# Altium footprint library MH_DA_THU_VIEN_16122016.PcbLib: 531 footprints (part 3 of 34)
Each footprint in its own frame and in the unit in brackets; x right, y up, seen from the top. Pads: shape width x height; smd on the part's side, far side on the other; paste and mask are expansions set on the pad; w line width, h text height; cw(c..) or ccw(c..) is an arc to the next point about the centre after c.
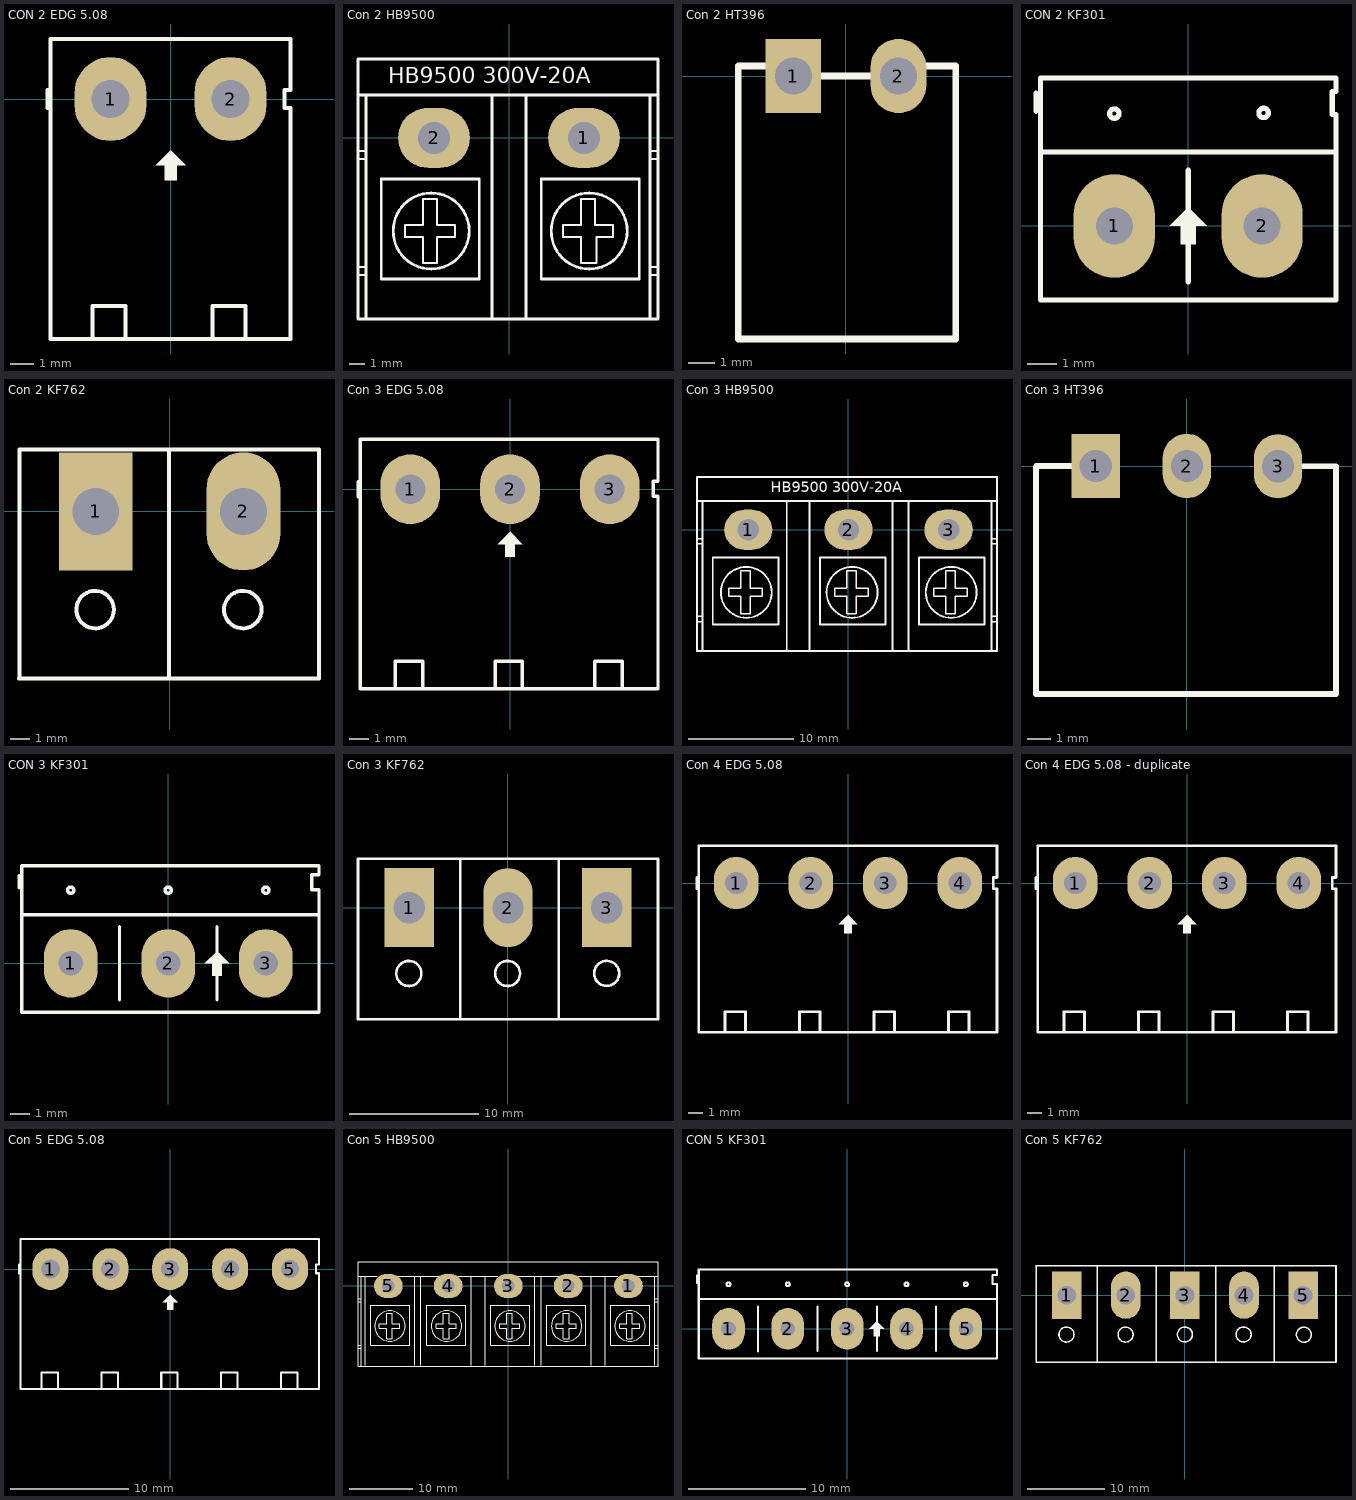
[diagram p2: the footprints below, top view; thin cyan lines are the x and y axes]

## CON 2 EDG 5.08 [mil]
pads (2):
  oval 120x140 hole 62.99: 1(-100,0) 2(100,0)
Top Overlay:
  region: 0,-85 -25,-110 -10,-110 -10,-135 10,-135 10,-110 25,-110
  lines w7: -205,-15 -205,15 ; -200,77 -200,-400 200,-400 200,-15 190,-15 190,15 200,15 200,77 ; -200,100 200,100 ; -130,-400 -130,-345 -75,-345 -75,-400 ; 70,-400 70,-345 125,-345 125,-400
  lines w7.01: -200,77 -200,100 ; 200,76 200,100
3D body: height 333.51, standoff -157.48, extent -196.7,-399.22 197,73.22

## Con 2 HB9500 [mil]
pads (2):
  oval 180x150 hole 80: 1(187.5,0) 2(-187.5,0)
Top Overlay:
  circle w7: c-194.5,-233 r95
  circle w7: c200.5,-233 r95
  lines w5: -375,-343 -360,-343 ; -375,-323 -360,-323 ; -375,-53 -360,-53 ; -375,-33 -360,-33 ; 355,-343 370,-343 ; 355,-323 370,-323 ; 355,-53 370,-53 ; 355,-33 370,-33 ; -259.5,-248 -259.5,-218 -214.5,-218 -214.5,-153 -179.5,-153 -179.5,-218 -134.5,-218 -134.5,-248 -179.5,-248 -179.5,-313 -214.5,-313 -214.5,-248 -259.5,-248 ; 135.5,-248 180.5,-248 180.5,-313 218.5,-313 218.5,-248 260.5,-248 260.5,-218 215.5,-218 215.5,-153 180.5,-153 180.5,-218 135.5,-218 135.5,-248
  lines w7: -377.5,107 -247.5,107 ; -377.5,196.85 372.5,196.85 ; -377.5,197 -377.5,-453 372.5,-453 372.5,197 ; -357.5,-448 -357.5,107 ; -253.5,107 242.5,107 372.5,107 ; -42.5,-448 -42.5,107 ; 42.5,-448 42.5,107 ; 352.5,-448 352.5,107 ; -319.5,-353 -74.5,-353 -74.5,-103 -319.5,-103 -319.5,-353 ; 80.5,-353 80.5,-103 325.5,-103 325.5,-353 80.5,-353
  text "HB9500 300V-20A" at -302.5,137 h40
3D body: height 500.6, standoff -199.4, extent -354,-424 357,176

## Con 2 HT396 [mm]
pads (2):
  rect 2.1x2.794 hole 1.4: 1(-1.98,0)
  oval 2.1x2.794 hole 1.4: 2(1.98,0)
Top Overlay:
  lines w0.254: -3.065,0.381 -4.056,0.381 -4.056,-9.906 4.14,-9.906 4.14,0.381 2.33,0.381 ccw(c2.33,0.07) 2.11,0.29 ; -1.98,0 1.98,0
3D body: height 7.02, standoff 0.02, extent -4.06,-9.99 3.94,0.01

## CON 2 KF301 [mil]
pads (2):
  oval 110x140 hole 50: 1(-100,0) 2(100,0)
Top Overlay:
  circle w7: c102,153 r6.4
  circle w7: c-100,152 r6.4
  region: 0,25 -25,0 -10,0 -10,-25 10,-25 10,0 25,0
  lines w7: -206,155 -206,180 ; -198,100 199,100 ; -200,-100 -200,50 -200,200 200,200 200,182 195,182 195,151 200,151 200,-100 -200,-100
  lines w7.87: 0,-75 0,75
3D body: height 393.7, standoff -157.48, extent -196.85,-97.64 196.85,197.64

## Con 2 KF762 [mil]
pads (2):
  rect 150x240 hole 95: 1(-150,0)
  oval 150x240 hole 95: 2(150,0)
Top Overlay:
  circle w8: c-151.2,-199.3 r38.08
  circle w8: c148.8,-199.3 r38.08
  lines w7.87: -305.74,-338.57 -305.74,-338.97 303.5,-338.97 ; -305,-339 -305,126 303.26,126 303.26,-338.57 303.26,-338.97 ; -1.2,-339.36 -1.2,125.7

## Con 3 EDG 5.08 [mil]
pads (3):
  oval 120x140 hole 60: 1(-200,0) 2(0,0) 3(200,0)
Top Overlay:
  region: 0,-85 -25,-110 -10,-110 -10,-135 10,-135 10,-110 25,-110
  lines w7: -305.03,-15.03 -305.03,14.97 ; -230.03,-400.03 -230.03,-345.03 -175.03,-345.03 -175.03,-400.03 ; -30.03,-400.03 -30.03,-345.03 24.97,-345.03 24.97,-400.03 ; 169.97,-400.03 169.97,-345.03 224.97,-345.03 224.97,-400.03 ; 296.97,-400.03 -300.03,-400.03 -300.03,99.97 296.97,99.97 296.97,15.97 286.97,15.97 286.97,-14.03 296.97,-14.03 296.97,-399.03
3D body: height 334.11, standoff -156.88, extent -97.96,-404.25 98.9,68.19
3D body: height 334.11, standoff -156.88, extent -296.03,-404.25 -99.18,68.19
3D body: height 334.11, standoff -156.88, extent 100.12,-404.25 296.97,68.19

## Con 3 HB9500 [mil]
pads (3):
  oval 180x150 hole 80: 1(-374.02,0) 2(0,0) 3(374.02,0)
Top Overlay:
  circle w7: c13.5,-234 r95
  circle w7: c-381.5,-234 r95
  circle w7: c383.5,-234 r95
  lines w5: -563,-343 -548,-343 ; -563,-323 -548,-323 ; -563,-53 -548,-53 ; -563,-33 -548,-33 ; 537,-343 552,-343 ; 537,-323 552,-323 ; 537,-53 552,-53 ; 537,-33 552,-33 ; -446.5,-249 -401.5,-249 -401.5,-314 -366.5,-314 -366.5,-249 -321.5,-249 -321.5,-219 -366.5,-219 -366.5,-154 -401.5,-154 -401.5,-219 -446.5,-219 -446.5,-249 ; -51.5,-249 -51.5,-219 -6.5,-219 -6.5,-154 28.5,-154 28.5,-219 73.5,-219 73.5,-249 28.5,-249 28.5,-314 -6.5,-314 -6.5,-249 -51.5,-249 ; 318.5,-249 363.5,-249 363.5,-314 398.5,-314 398.5,-249 443.5,-249 443.5,-219 398.5,-219 398.5,-154 363.5,-154 363.5,-219 318.5,-219 318.5,-249
  lines w7: -565.5,107 -435.5,107 ; -565.5,196.85 554,196.85 ; -565.5,197 -565.5,-453 554.5,-453 554.5,197 ; -545.5,-448 -545.5,107 ; -437.02,107 56.98,107 ; -230.5,-448 -230.5,107 ; -145.5,-448 -145.5,107 ; 54.5,107 424.98,107 ; 164.5,-448 164.5,107 ; 224.5,-448 224.5,107 ; 424.5,107 554.5,107 ; 534.5,-448 534.5,107 ; -506.5,-354 -506.5,-104 -261.5,-104 -261.5,-354 -506.5,-354 ; -106.5,-354 138.5,-354 138.5,-104 -106.5,-104 -106.5,-354 ; 263.5,-354 263.5,-104 508.5,-104 508.5,-354 263.5,-354
  text "HB9500 300V-20A" at -290,140 h40

## Con 3 HT396 [mm]
pads (3):
  rect 2.1x2.794 hole 1.4: 1(-3.96,0)
  oval 2.1x2.794 hole 1.4: 2(0,0) 3(3.96,-0.01)
Top Layer:
  lines w0.254: 3.96,-0.01 3.96,0
Top Overlay:
  lines w0.254: -6.553,-0.04 -6.553,-9.906 6.477,-9.906 6.477,-0.01 ; -6.54,0 -3.96,0 ; 3.96,-0.01 6.42,-0.01 6.42,-0.05

## CON 3 KF301 [mil]
pads (3):
  oval 110x140 hole 50: 1(-200,0) 2(0,0) 3(200,0)
Top Overlay:
  circle w7: c-200,150 r6.4
  circle w7: c200,150 r6.4
  circle w7: c0,150 r6.4
  region: 100,25 75,0 90,0 90,-25 110,-25 110,0 125,0
  lines w7: -306.06,154.94 -306.06,179.94 ; -300.06,99.94 309,99.94 ; -100,-75 -100,75 ; 99.94,-75 99.94,75 ; -300.06,-100.06 -300.06,49.94 -300.06,199.94 309,199.94 309,181.94 294,181.94 294,150.94 309,150.94 309,-100.06 -300.06,-100.06

## Con 3 KF762 [mil]
pads (3):
  rect 150x240 hole 95: 1(-300,0) 3(300,0)
  oval 150x240 hole 95: 2(0,0)
Top Overlay:
  circle w8: c300,-199.7 r38.08
  circle w8: c-1.2,-200 r38.08
  circle w8: c-301.2,-200 r38.08
  lines w7.87: -145,-339.7 -145,149.3 ; 154,-339.67 154,148.3 ; 456,148.3 456,-339.67 -455.74,-339.67 -455.74,-339.27 -455.74,149.3 456,149.3

## Con 4 EDG 5.08 [mil]
pads (4):
  oval 120x140 hole 60: 1(-300,0) 2(-100,0) 3(100,0) 4(300,0)
Top Overlay:
  region: 0,-85 -25,-110 -10,-110 -10,-135 10,-135 10,-110 25,-110
  lines w7: -405.2,-15.2 -405.2,14.8 ; -330.2,-400.2 -330.2,-345.2 -275.2,-345.2 -275.2,-400.2 ; -130.2,-400.2 -130.2,-345.2 -75.2,-345.2 -75.2,-400.2 ; 69.8,-400.2 69.8,-345.2 124.8,-345.2 124.8,-400.2 ; 269.8,-395.2 269.8,-346 ; 269.8,-345.2 324.8,-345.2 ; 324.8,-395.2 324.8,-346 ; -400.2,-400.2 -400.2,99.8 399.8,99.8 399.8,14.8 389.8,14.8 389.8,-15.2 399.8,-15.2 399.8,-400.2 -400.2,-400.2
3D body: height 334.11, standoff -156.88, extent 199.95,-402.42 396.8,70.02
3D body: height 334.11, standoff -156.88, extent -197.48,-402.42 -0.63,70.02
3D body: height 334.11, standoff -156.88, extent -396.19,-402.42 -199.34,70.02
3D body: height 334.11, standoff -156.88, extent 1.24,-402.42 198.09,70.02

## Con 4 EDG 5.08 - duplicate [mil]
pads (4):
  oval 120x140 hole 60: 1(-300,0) 2(-100,0) 3(100,0) 4(300,0)
Top Overlay:
  region: 0,-85 -25,-110 -10,-110 -10,-135 10,-135 10,-110 25,-110
  lines w7: -405.2,-15.2 -405.2,14.8 ; -330.2,-400.2 -330.2,-345.2 -275.2,-345.2 -275.2,-400.2 ; -130.2,-400.2 -130.2,-345.2 -75.2,-345.2 -75.2,-400.2 ; 69.8,-400.2 69.8,-345.2 124.8,-345.2 124.8,-400.2 ; 269.8,-395.2 269.8,-346 ; 269.8,-345.2 324.8,-345.2 ; 324.8,-395.2 324.8,-346 ; -400.2,-400.2 399.8,-400.2 399.8,-15.2 389.8,-15.2 389.8,14.8 399.8,14.8 399.8,99.8 -400.2,99.8 -400.2,-400.2
3D body: height 334.11, standoff -156.88, extent 1.24,-402.42 198.09,70.02
3D body: height 334.11, standoff -156.88, extent -396.19,-402.42 -199.34,70.02
3D body: height 334.11, standoff -156.88, extent -197.48,-402.42 -0.63,70.02
3D body: height 334.11, standoff -156.88, extent 199.95,-402.42 396.8,70.02

## Con 5 EDG 5.08 [mil]
pads (5):
  oval 120x140 hole 62.99: 1(-400,0) 2(-200,0)
  oval 120x140 hole 60: 3(0,0) 4(200,0) 5(400,0)
Top Overlay:
  region: 0,-85 -25,-110 -10,-110 -10,-135 10,-135 10,-110 25,-110
  lines w7: -505,-15 -505,15 ; -500,77 -500,-400 -100,-400 497,-400 ; -500,100 -100,100 497,100 497,16 487,16 487,-14 497,-14 497,-399 ; -430,-400 -430,-345 -375,-345 -375,-400 ; -230,-400 -230,-345 -175,-345 -175,-400 ; -30,-400 -30,-345 25,-345 25,-400 ; 170,-400 170,-345 225,-345 225,-400 ; 370,-400 370,-345 425,-345 425,-400
  lines w7.01: -500,77 -500,100
3D body: height 334.11, standoff -156.88, extent -298.43,-403.22 -101.57,69.22
3D body: height 334.11, standoff -156.88, extent -498.43,-403.22 -301.57,69.22
3D body: height 334.11, standoff -156.88, extent 101.57,-403.22 298.43,69.22
3D body: height 334.11, standoff -156.88, extent -98.43,-403.22 98.43,69.22
3D body: height 334.11, standoff -156.88, extent 301.57,-403.22 498.43,69.22

## Con 5 HB9500 [mil]
pads (5):
  oval 180x150 hole 80: 1(749,0) 2(374,0) 3(0,0) 4(-375,0) 5(-749,0)
Top Overlay:
  circle w7: c-739,-250 r95
  circle w7: c10,-250 r95
  circle w7: c-385,-250 r95
  circle w7: c364,-250 r95
  circle w7: c759,-250 r95
  lines w5: -935.5,-390 -920.5,-390 ; -935.5,-370 -920.5,-370 ; -935.5,-100 -920.5,-100 ; -935.5,-80 -920.5,-80 ; 916.5,-390 931.5,-390 ; 916.5,-370 931.5,-370 ; 916.5,-100 931.5,-100 ; 916.5,-80 931.5,-80 ; -804,-265 -804,-235 -759,-235 -759,-170 -724,-170 -724,-235 -679,-235 -679,-265 -724,-265 -724,-330 -759,-330 -759,-265 -804,-265 ; -450,-265 -405,-265 -405,-330 -370,-330 -370,-265 -325,-265 -325,-235 -370,-235 -370,-170 -405,-170 -405,-235 -450,-235 -450,-265 ; -55,-265 -55,-235 -10,-235 -10,-170 25,-170 25,-235 70,-235 70,-265 25,-265 25,-330 -10,-330 -10,-265 -55,-265 ; 299,-265 299,-235 344,-235 344,-170 379,-170 379,-235 424,-235 424,-265 379,-265 379,-330 344,-330 344,-265 299,-265 ; 694,-265 739,-265 739,-330 774,-330 774,-265 819,-265 819,-235 774,-235 774,-170 739,-170 739,-235 694,-235 694,-265
  lines w7: -938,150 -938,-499.5 -937.5,-500 -564,-500 ; -937.5,62 -816.5,62 ; -936.5,150 -564,150 ; -918,-499 -918,61 ; -894,-495 -894,60 ; -694,60 -564,60 ; -584,-495 -584,60 ; -565,-500 185,-500 ; -565,60 -435,60 ; -565,150 185,150 ; -545,-495 -545,60 ; -315,60 -65,60 ; -230,-495 -230,60 ; -145,-495 -145,60 ; 55,60 185,60 ; 165,-495 165,60 ; 184,-500 934,-500 934,150 184,150 ; 184,60 314,60 ; 204,-495 204,60 ; 434,60 684,60 ; 519,-495 519,60 ; 604,-495 604,60 ; 804,60 934,60 ; 914,-495 914,60 ; -859,-370 -614,-370 -614,-120 -859,-120 -859,-370 ; -510,-370 -510,-120 -265,-120 -265,-370 -510,-370 ; -110,-370 135,-370 135,-120 -110,-120 -110,-370 ; 239,-370 484,-370 484,-120 239,-120 239,-370 ; 639,-370 639,-120 884,-120 884,-370 639,-370

## CON 5 KF301 [mil]
pads (5):
  oval 110x140 hole 50: 1(-400,0) 2(-200,0) 3(0,0) 4(200,0) 5(400,0)
Top Overlay:
  circle w7: c200,150 r6.4
  circle w7: c0,150 r6.4
  circle w7: c-400,150 r6.4
  circle w7: c-200,150 r6.4
  circle w7: c400,150 r6.4
  region: 100,25 75,0 90,0 90,-25 110,-25 110,0 125,0
  lines w7: -506.06,154.94 -506.06,179.94 ; -500.06,99.94 504.94,99.94 ; -300,-76 -300,75 ; -100,-75 -100,75 ; 100,-75 100,75 ; 300,-75 300,75 ; -500.06,-100.06 504.94,-100.06 504.94,150.94 489.94,150.94 489.94,181.94 504.94,181.94 504.94,199.94 -500.06,199.94 -500.06,49.94 -500.06,-100.06

## Con 5 KF762 [mil]
pads (5):
  rect 150x240 hole 95: 1(-600,0) 3(0,0) 5(600,0)
  oval 150x240 hole 95: 2(-300,0) 4(300,0)
Top Overlay:
  circle w8: c-601.2,-200 r38.08
  circle w8: c-301.2,-200 r38.08
  circle w8: c298,-199.7 r38.08
  circle w8: c0,-199.7 r38.08
  circle w8: c604,-200.7 r38.08
  lines w7.87: -756,149.3 767,149.3 767,-339.7 ; -755.74,-339.67 -755.74,-339.27 -755.74,149.3 ; -755,-339.7 767,-339.7 ; -445,-339.7 -445,149.3 ; -146,-340.7 -146,148.3 ; 156,-340.7 156,148.3 ; 453,-339.7 453,149.3 ; 767,125.3 767,-339.7